# Altium footprint library IC.PcbLib: 85 footprints (part 4 of 6)
Each footprint in its own frame and in the unit in brackets; x right, y up, seen from the top. Pads: shape width x height; smd on the part's side, far side on the other; paste and mask are expansions set on the pad; w line width, h text height; cw(c..) or ccw(c..) is an arc to the next point about the centre after c.
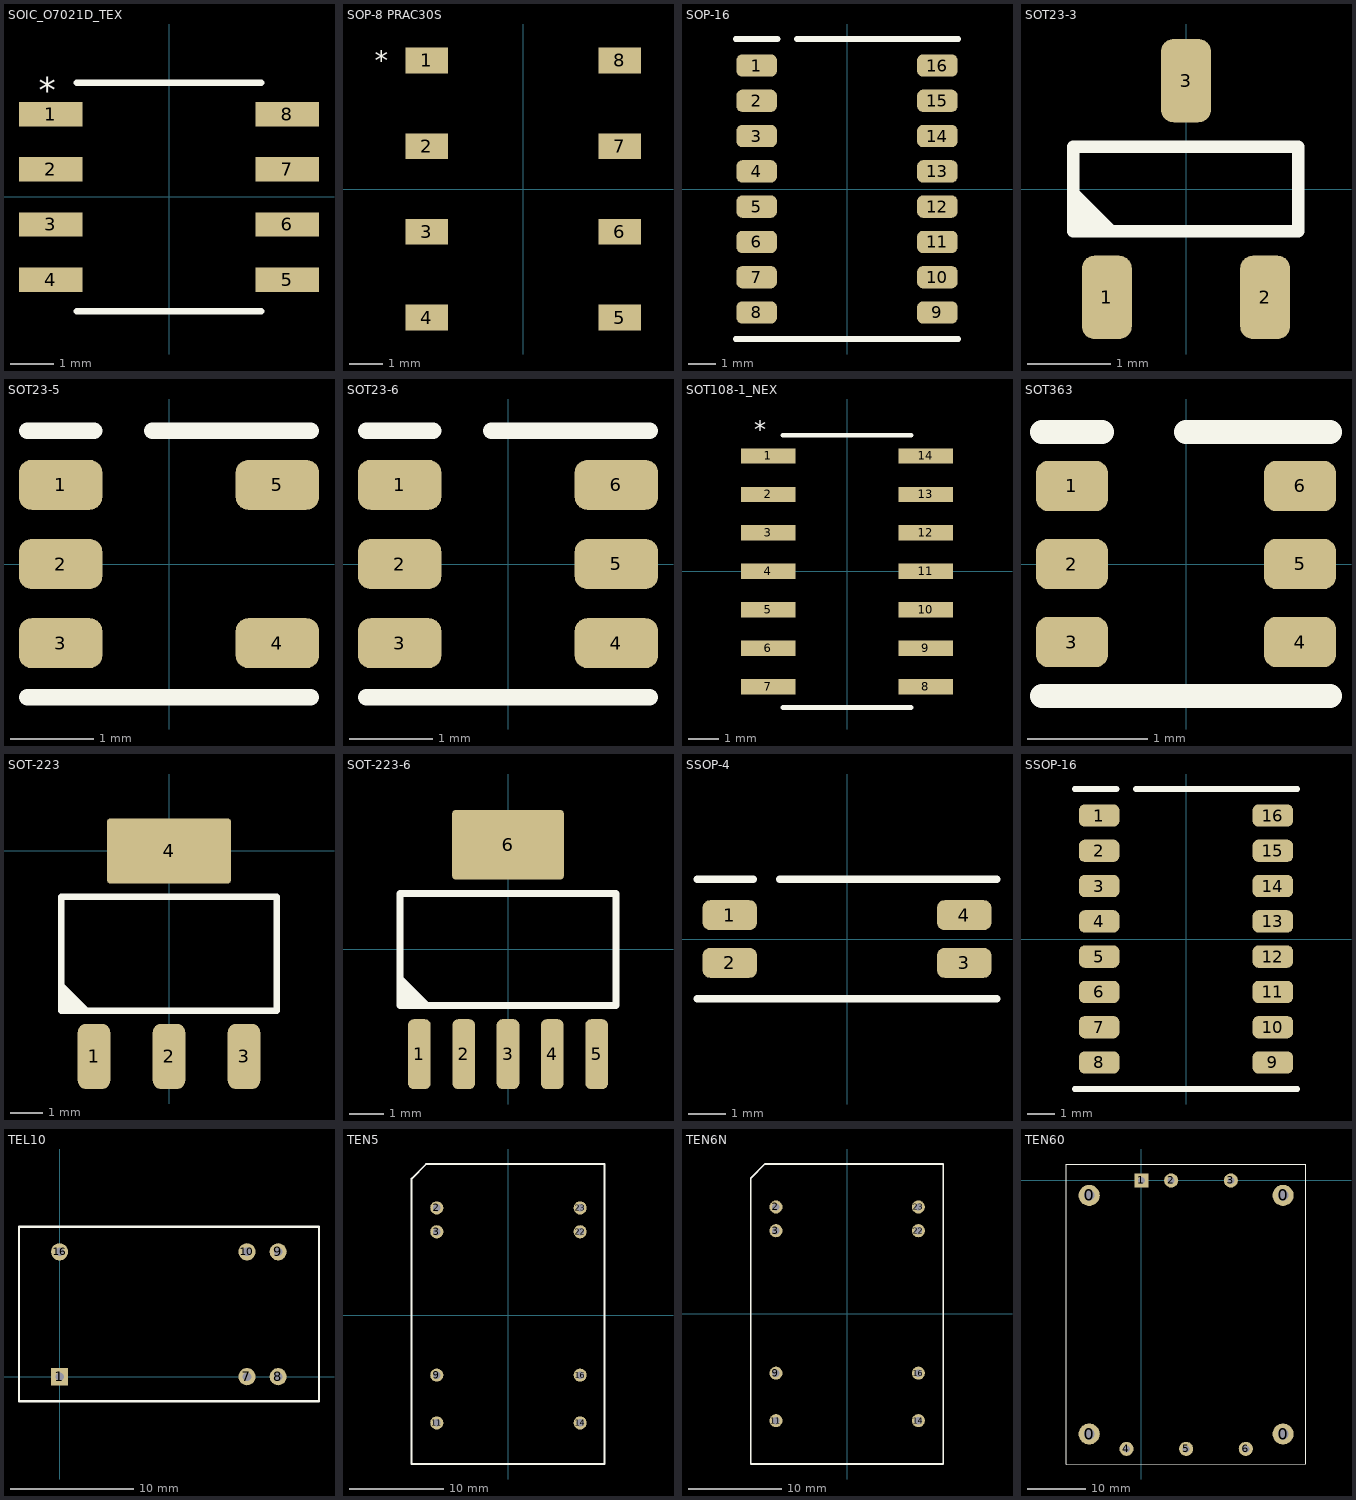
[diagram p3: the footprints below, top view; thin cyan lines are the x and y axes]

## SOIC_O7021D_TEX [mil]
pads (8):
  rect 57.5x22 smd paste+0 mask+0: 1(-107.25,75) 2(-107.25,25) 3(-107.25,-25) 4(-107.25,-75) 5(107.25,-75) 6(107.25,-25) 7(107.25,25) 8(107.25,75)
Top Overlay:
  lines w6: -83.5,-103.5 83.5,-103.5 ; -83.5,103.5 83.5,103.5
  text "*" at -118.11,78.74 h39.37
3D body "D0008B.stp": height 64, standoff 0, extent -118.56,-96.5 118.56,96.5

## SOP-8 PRAC30S [mm]
pads (8):
  rect 1.27x0.76 smd: 1(-2.86,3.81) 2(-2.86,1.27) 3(-2.86,-1.27) 4(-2.86,-3.81) 5(2.86,-3.81) 6(2.86,-1.27) 7(2.86,1.27) 8(2.86,3.81)
Top Overlay:
  text "*" at -4.4,3.321 h1
3D body: height 2, standoff 0, extent -3.4,-4.7 3.4,4.7

## SOP-16 [mm]
pads (16):
  rrect50% 1.45x0.8 smd: 1(-3.251,4.445) 2(-3.251,3.175) 3(-3.251,1.905) 4(-3.251,0.635) 5(-3.251,-0.635) 6(-3.251,-1.905) 7(-3.251,-3.175) 8(-3.251,-4.445) 9(3.251,-4.445) 10(3.251,-3.175) 11(3.251,-1.905) 12(3.251,-0.635) 13(3.251,0.635) 14(3.251,1.905) 15(3.251,3.175) 16(3.251,4.445)
Top Overlay:
  lines w0.2: -4,-5.4 4,-5.4 ; -4,5.4 -2.502,5.4 ; -1.8,5.4 4,5.4
3D body "TLP280-4_TOS.step": height 1.91, standoff 0, extent -3.696,-5.27 3.696,5.27

## SOT23-3 [mm]
pads (3):
  rrect50% 0.6x1 smd: 1(-0.95,-1.3) 2(0.95,-1.3) 3(0,1.3)
Top Overlay:
  region: -1.353,-0.508 -1.353,0.053 -0.792,-0.508
  lines w0.15: -1.353,-0.508 -1.353,0.508 1.347,0.508 1.347,-0.508 -1.353,-0.508
3D body "SOT23_BZX84C_3X1P4_DIO.step": height 1.09, standoff 0, extent -1.448,-1.245 1.448,1.245

## SOT23-5 [mm]
pads (5):
  rrect50% 1x0.6 smd: 1(-1.3,0.95) 2(-1.3,0) 3(-1.3,-0.95) 4(1.3,-0.95) 5(1.3,0.95)
Top Overlay:
  lines w0.2: -1.7,-1.6 1.7,-1.6 ; -1.7,1.6 -0.9,1.6 ; -0.2,1.6 1.7,1.6
3D body "DBV0005A.stp": height 1.2, standoff 0, extent -1.4,-1.45 1.4,1.45

## SOT23-6 [mm]
pads (6):
  rrect50% 1x0.6 smd: 1(-1.3,0.95) 2(-1.3,0) 3(-1.3,-0.95) 4(1.3,-0.95) 5(1.3,0) 6(1.3,0.95)
Top Overlay:
  lines w0.2: -1.7,-1.6 1.7,-1.6 ; -1.7,1.6 -0.9,1.6 ; -0.2,1.6 1.7,1.6
3D body "DBV0006A.stp": height 1.2, standoff 0, extent -1.4,-1.45 1.4,1.45

## SOT108-1_NEX [mm]
pads (14):
  rect 1.8x0.5 smd paste+0 mask+0: 1(-2.603,3.81) 2(-2.603,2.54) 3(-2.603,1.27) 4(-2.603,0) 5(-2.603,-1.27) 6(-2.603,-2.54) 7(-2.603,-3.81) 8(2.603,-3.81) 9(2.603,-2.54) 10(2.603,-1.27) 11(2.603,0) 12(2.603,1.27) 13(2.603,2.54) 14(2.603,3.81)
Top Overlay:
  lines w0.152: -2.121,-4.496 2.121,-4.496 ; -2.121,4.496 2.121,4.496
  text "*" at -2.667,4.191 h1
3D body "SOT108-1_NEX.step": height 1.76, standoff 0, extent -3.099,-4.369 3.099,4.369

## SOT363 [mm]
pads (6):
  rrect50% 0.6x0.42 smd: 1(-0.95,0.65) 2(-0.95,0) 3(-0.95,-0.65) 4(0.95,-0.65) 5(0.95,0) 6(0.95,0.65)
Top Overlay:
  lines w0.2: -1.2,-1.1 1.2,-1.1 ; -1.2,1.1 -0.7,1.1 ; 0,1.1 1.2,1.1
3D body "NL27WZ17DFT2G.STEP": height 1, standoff -0.1, extent -1.05,-1 1.05,1

## SOT-223 [mm]
pads (4):
  rrect50% 1x2 smd: 1(-2.3,-6.3) 2(0,-6.3) 3(2.3,-6.3)
  rrect10% 3.8x2 smd: 4(0,0)
Top Overlay:
  region: -3.3,-4.9 -3.3,-4 -2.4,-4.9
  lines w0.2: -3.3,-4.9 -3.3,-1.4 3.3,-1.4 3.3,-4.9 -3.3,-4.9
3D body "LD1117S50TR.STEP": height 1.8, standoff 0, extent -3.25,-6.599 3.25,0.399

## SOT-223-6 [mm]
pads (6):
  rrect50% 0.65x2 smd: 1(-2.54,-3) 2(-1.27,-3) 3(0,-3) 4(1.27,-3) 5(2.54,-3)
  rrect10% 3.2x2 smd: 6(0,3)
Top Overlay:
  region: -3.1,-1.6 -3.1,-0.7 -2.2,-1.6
  lines w0.2: -3.1,-1.6 -3.1,1.6 3.1,1.6 3.1,-1.6 -3.1,-1.6
3D body "DCQ6.step": height 1.81, standoff 0, extent -3.277,-3.632 3.277,3.632

## SSOP-4 [mm]
pads (4):
  rrect50% 1.45x0.8 smd: 1(-3.125,0.635) 2(-3.125,-0.635) 3(3.125,-0.635) 4(3.125,0.635)
Top Overlay:
  lines w0.2: -4,-1.59 4,-1.59 ; -4,1.59 -2.502,1.59 ; -1.8,1.59 4,1.59
3D body "PS2801-1_REN.step": height 2.11, standoff 0, extent -3.645,-1.499 3.645,1.499

## SSOP-16 [mm]
pads (16):
  rrect50% 1.45x0.8 smd: 1(-3.125,4.445) 2(-3.125,3.175) 3(-3.125,1.905) 4(-3.125,0.635) 5(-3.125,-0.635) 6(-3.125,-1.905) 7(-3.125,-3.175) 8(-3.125,-4.445) 9(3.125,-4.445) 10(3.125,-3.175) 11(3.125,-1.905) 12(3.125,-0.635) 13(3.125,0.635) 14(3.125,1.905) 15(3.125,3.175) 16(3.125,4.445)
Top Overlay:
  lines w0.2: -4,-5.4 4,-5.4 ; -4,5.4 -2.502,5.4 ; -1.8,5.4 4,5.4
3D body "PS2801-4_REN.step": height 2.31, standoff 0, extent -3.645,-5.296 3.645,5.296

## TEL10 [mm]
pads (6):
  rect 1.4x1.4 hole 0.7: 1(0,0)
  round 1.4 hole 0.7: 7(15.24,0) 8(17.78,0) 9(17.78,10.16) 10(15.24,10.16) 16(0,10.16)
Top Overlay:
  lines w0.2: -3.3,-2 -3.3,12.2 21.1,12.2 21.1,-2 -3.3,-2
3D body "tel10wi_3d_drawing.stp": height 8.71, standoff -3.59, extent -3.15,-1.9 20.95,12.1

## TEN5 [mm]
pads (8):
  round 1.4 hole 0.8: 2(-7.62,11.43) 3(-7.62,8.89) 9(-7.62,-6.35) 11(-7.62,-11.43) 14(7.62,-11.43) 16(7.62,-6.35) 22(7.62,8.89) 23(7.62,11.43)
Top Overlay:
  lines w0.2: -10.3,-15.8 10.2,-15.8 10.2,16.1 -8.75,16.1 -10.3,14.55 -10.3,-15.8
3D body "ten5wi_dual_3d_drawing.stp": height 10.2, standoff -4.1, extent -10.17,-15.75 10.15,16

## TEN6N [mm]
pads (8):
  round 1.4 hole 0.8: 2(-7.62,11.43) 3(-7.62,8.89) 9(-7.62,-6.35) 11(-7.62,-11.43) 14(7.62,-11.43) 16(7.62,-6.35) 22(7.62,8.89) 23(7.62,11.43)
Top Overlay:
  lines w0.2: -10.32,-16.07 -10.32,14.53 -8.82,16.03 10.28,16.03 10.28,-16.07 -10.32,-16.07
3D body "ten6n_dual_3d_drawing.stp": height 10.2, standoff -4.1, extent -10.16,-15.926 10.14,15.874

## TEN60 [mm]
pads (10):
  round 3.6 hole 1.8: 0(-8.89,-43.19) 0(-8.89,-2.55) 0(24.13,-43.19) 0(24.13,-2.55)
  rect 2.4x2.4 hole 1.2: 1(0,0)
  round 2.4 hole 1.2: 2(5.08,0) 3(15.24,0) 4(-2.54,-45.72) 5(7.62,-45.72) 6(17.78,-45.72)
Top Overlay:
  lines w0.2: -12.8,-48.3 28,-48.3 28,2.8 -12.8,2.8 -12.8,-48.3
3D body "TEN_60-4823WIR.stp": height 24.4, standoff -5.6, extent -12.7,-48.26 27.94,2.74